# Altium footprint library ICs And Semiconductors SMD.PcbLib: 943 footprints (part 23 of 60)
Each footprint in its own frame and in the unit in brackets; x right, y up, seen from the top. Pads: shape width x height; smd on the part's side, far side on the other; paste and mask are expansions set on the pad; w line width, h text height; cw(c..) or ccw(c..) is an arc to the next point about the centre after c.
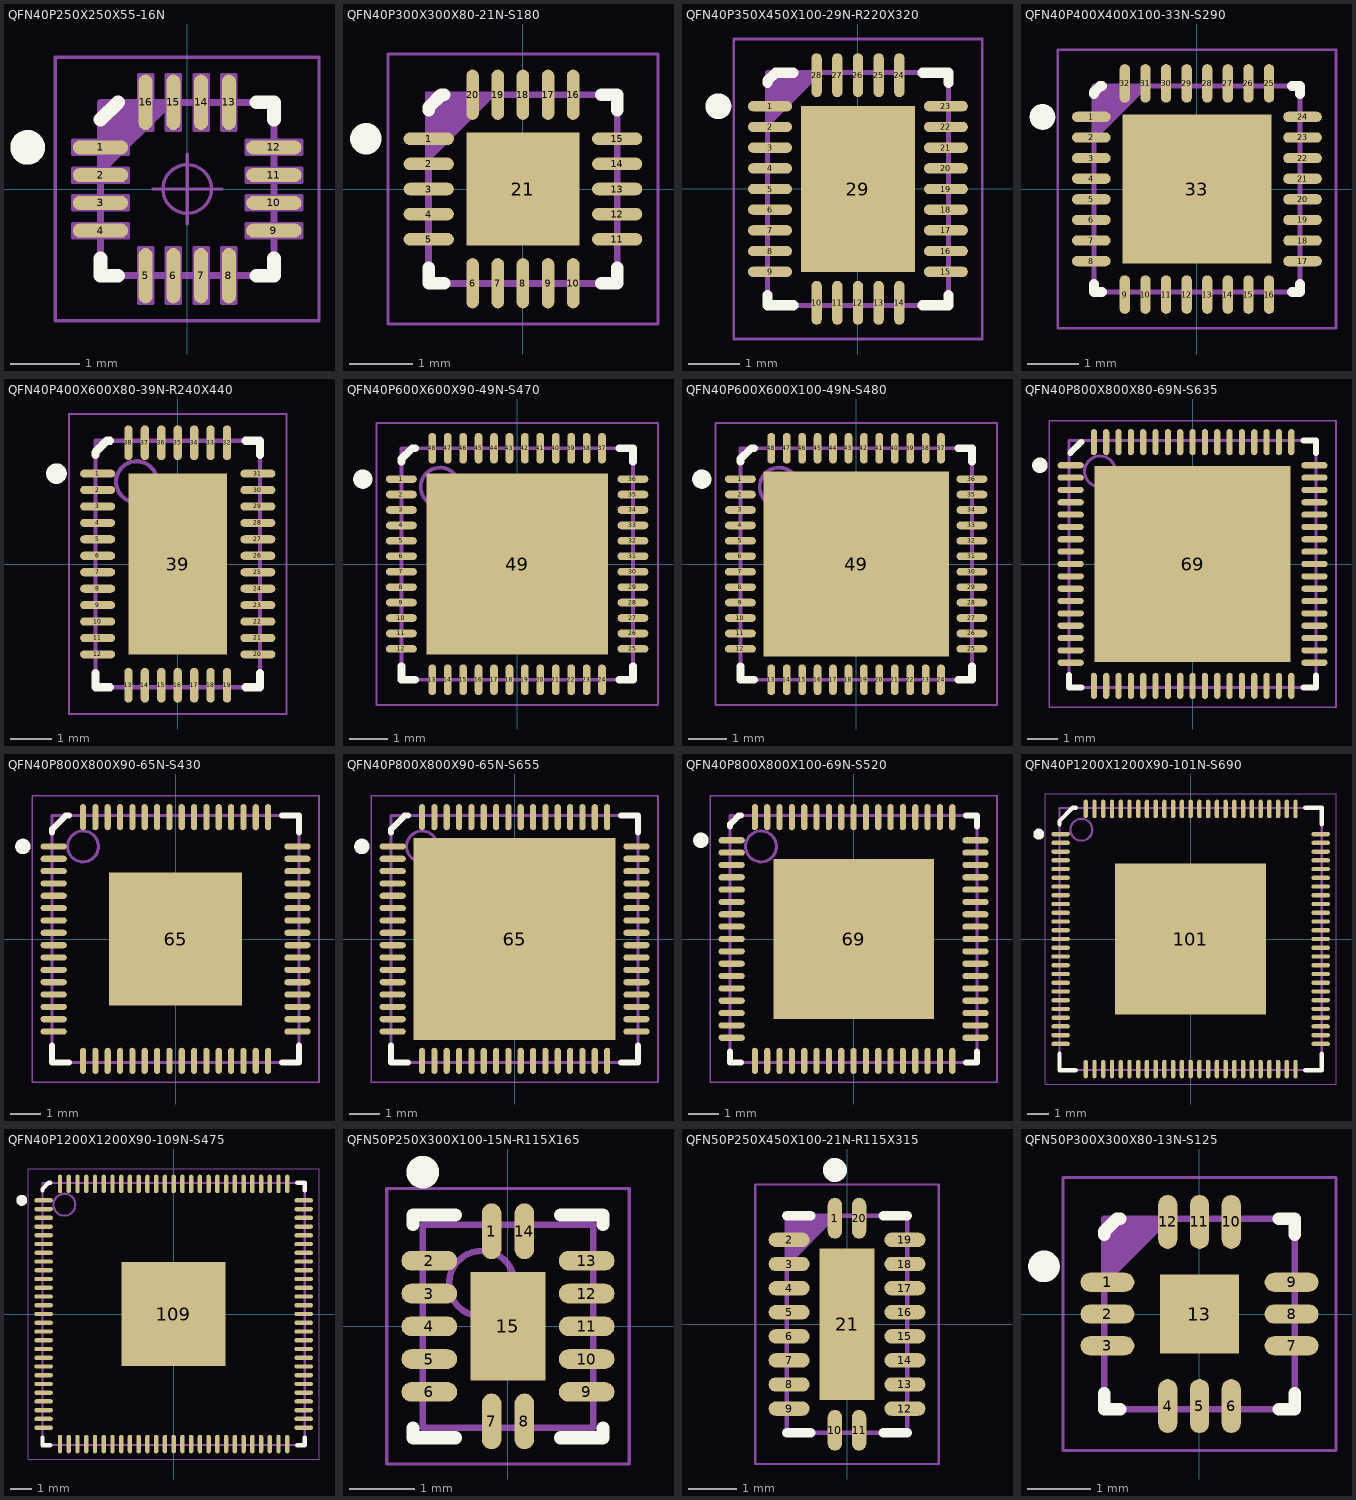
[diagram p22: the footprints below, top view; thin cyan lines are the x and y axes]

## QFN40P250X250X55-16N [mm] "QFN, 0.40mm Pitch, Square; 16 Pin, 2.50mm L X 2.50mm W X 0.55mm H Body, IPC Medium Density"
height 0.55
pads (16):
  oval 0.8x0.2 smd: 1(-1.25,0.6) 2(-1.25,0.2) 3(-1.25,-0.2) 4(-1.25,-0.6) 9(1.25,-0.6) 10(1.25,-0.2) 11(1.25,0.2) 12(1.25,0.6)
  oval 0.2x0.8 smd: 5(-0.6,-1.25) 6(-0.2,-1.25) 7(0.2,-1.25) 8(0.6,-1.25) 13(0.6,1.25) 14(0.2,1.25) 15(-0.2,1.25) 16(-0.6,1.25)
Top Overlay:
  circle w0.25: c-2.3,0.6 r0.125
  lines w0.2: -1.25,-1 -1.25,-1.25 -1,-1.25 ; -1.25,1 -1,1.25 ; 1,-1.25 1.25,-1.25 1.25,-1 ; 1,1.25 1.25,1.25 1.25,1
Mechanical 8:
  lines w0.05: -0.5,0 0,0 ; 0,-0.5 0,0 ; 0,0.5 0,0 ; 0.5,0 0,0 ; -1.65,-0.7 -0.85,-0.7 -0.85,-0.5 -1.65,-0.5 ; -1.65,-0.7 -1.65,-0.5 ; -1.65,-0.7 -1.25,-0.6 -1.65,-0.5 ; -1.65,-0.3 -0.85,-0.3 -0.85,-0.1 -1.65,-0.1 ; -1.65,-0.3 -1.65,-0.1 ; -1.65,-0.3 -1.25,-0.2 -1.65,-0.1 ; -1.65,0.1 -0.85,0.1 -0.85,0.3 -1.65,0.3 ; -1.65,0.1 -1.65,0.3 ; -1.65,0.1 -1.25,0.2 -1.65,0.3 ; -1.65,0.5 -0.85,0.5 -0.85,0.7 -1.65,0.7 ; -1.65,0.5 -1.65,0.7 ; -1.65,0.5 -1.25,0.6 -1.65,0.7 ; -0.7,-1.65 -0.7,-0.85 -0.5,-0.85 -0.5,-1.65 ; -0.7,-1.65 -0.5,-1.65 ; -0.7,-1.65 -0.6,-1.25 -0.5,-1.65 ; -0.7,1.65 -0.7,0.85 -0.5,0.85 -0.5,1.65 ; -0.7,1.65 -0.5,1.65 ; -0.7,1.65 -0.6,1.25 -0.5,1.65 ; -0.3,-1.65 -0.3,-0.85 -0.1,-0.85 -0.1,-1.65 ; -0.3,-1.65 -0.1,-1.65 ; -0.3,-1.65 -0.2,-1.25 -0.1,-1.65 ; -0.3,1.65 -0.3,0.85 -0.1,0.85 -0.1,1.65 ; -0.3,1.65 -0.1,1.65 ; -0.3,1.65 -0.2,1.25 -0.1,1.65 ; 0.1,-1.65 0.1,-0.85 0.3,-0.85 0.3,-1.65 ; 0.1,-1.65 0.3,-1.65 ; 0.1,-1.65 0.2,-1.25 0.3,-1.65 ; 0.1,1.65 0.1,0.85 0.3,0.85 0.3,1.65 ; 0.1,1.65 0.3,1.65 ; 0.1,1.65 0.2,1.25 0.3,1.65 ; 0.5,-1.65 0.5,-0.85 0.7,-0.85 0.7,-1.65 ; 0.5,-1.65 0.7,-1.65 ; 0.5,-1.65 0.6,-1.25 0.7,-1.65 ; 0.5,1.65 0.5,0.85 0.7,0.85 0.7,1.65 ; 0.5,1.65 0.7,1.65 ; 0.5,1.65 0.6,1.25 0.7,1.65 ; 1.65,-0.7 0.85,-0.7 0.85,-0.5 1.65,-0.5 ; 1.65,-0.7 1.65,-0.5 ; 1.65,-0.7 1.25,-0.6 1.65,-0.5 ; 1.65,-0.3 0.85,-0.3 0.85,-0.1 1.65,-0.1 ; 1.65,-0.3 1.65,-0.1 ; 1.65,-0.3 1.25,-0.2 1.65,-0.1 ; 1.65,0.1 0.85,0.1 0.85,0.3 1.65,0.3 ; 1.65,0.1 1.65,0.3 ; 1.65,0.1 1.25,0.2 1.65,0.3 ; 1.65,0.5 0.85,0.5 0.85,0.7 1.65,0.7 ; 1.65,0.5 1.65,0.7 ; 1.65,0.5 1.25,0.6 1.65,0.7
Mechanical 14:
  lines w0.1: -1.25,0.25 -0.25,1.25 ; -1.25,0.35 -0.35,1.25 ; -1.25,0.45 -0.45,1.25 ; -1.25,0.55 -0.55,1.25 ; -1.25,0.65 -0.65,1.25 ; -1.25,0.75 -0.75,1.25 ; -1.25,0.85 -0.85,1.25 ; -1.25,0.95 -0.95,1.25 ; -1.25,1.05 -1.05,1.25 ; -1.25,1.15 -1.15,1.25 ; -1.25,-1.25 1.25,-1.25 1.25,1.25 -1.25,1.25 -1.25,-1.25
Mechanical 15:
  circle w0.05: c0,0 r0.35
  lines w0.05: -0.5,0 0.5,0 ; 0,-0.5 0,0.5 ; -1.9,-1.9 1.9,-1.9 1.9,1.9 -1.9,1.9 -1.9,-1.9
3D body "QFN40P250X250X55-16N.stp": height 0.55, standoff 0, extent -1.25,-1.25 1.25,1.25

## QFN40P300X300X80-21N-S180 [mm] "QFN, 0.40mm Pitch, Square, 20 Pin, 3.00mm L X 3.00mm W X 0.80mm H body (w/thermal tab)"
height 0.8
pads (21):
  oval 0.8x0.2 smd: 1(-1.5,0.8) 2(-1.5,0.4) 3(-1.5,0) 4(-1.5,-0.4) 5(-1.5,-0.8) 11(1.5,-0.8) 12(1.5,-0.4) 13(1.5,0) 14(1.5,0.4) 15(1.5,0.8)
  oval 0.2x0.8 smd: 6(-0.8,-1.5) 7(-0.4,-1.5) 8(0,-1.5) 9(0.4,-1.5) 10(0.8,-1.5) 16(0.8,1.5) 17(0.4,1.5) 18(0,1.5) 19(-0.4,1.5) 20(-0.8,1.5)
  rect 1.8x1.8 smd: 21(0,0)
Top Overlay:
  circle w0.25: c-2.5,0.8 r0.125
  lines w0.2: -1.5,-1.25 -1.5,-1.5 -1.25,-1.5 ; -1.5,1.25 -1.5,1.3 -1.3,1.5 -1.25,1.5 ; 1.25,-1.5 1.5,-1.5 1.5,-1.25 ; 1.25,1.5 1.5,1.5 1.5,1.25
Mechanical 8:
  lines w0.001: -1.55,-1.55 -1.55,1.55 1.55,1.55 1.55,-1.55 -1.55,-1.55
Mechanical 14:
  lines w0.1: -1.5,0.5 -0.5,1.5 ; -1.5,0.6 -0.6,1.5 ; -1.5,0.7 -0.7,1.5 ; -1.5,0.8 -0.8,1.5 ; -1.5,0.9 -0.9,1.5 ; -1.5,1 -1,1.5 ; -1.5,1.1 -1.1,1.5 ; -1.5,1.2 -1.2,1.5 ; -1.5,1.3 -1.3,1.5 ; -1.5,1.4 -1.4,1.5 ; -1.5,-1.5 -1.5,1.5 1.5,1.5 1.5,-1.5 -1.5,-1.5
Mechanical 15:
  circle w0.05: c0,0 r0.35
  lines w0.05: -0.5,0 0.5,0 ; 0,-0.5 0,0.5 ; -2.15,-2.15 -2.15,2.15 2.15,2.15 2.15,-2.15 -2.15,-2.15
3D body "QFN40P300X300X80-21N-S180.stp": height 0.8, standoff 0, extent -1.5,-1.5 1.5,1.5

## QFN40P350X450X100-29N-R220X320 [mm] "QFN, 0.40mm Pitch, Rect.; 28 Pin, 4.50mm L X 3.50mm W X 1.00mm H Body (W/Thermal Tab 2.2mm X 3.2mm), IPC Medium Density"
height 1
pads (29):
  oval 0.85x0.2 smd: 1(-1.7,1.6) 2(-1.7,1.2) 3(-1.7,0.8) 4(-1.7,0.4) 5(-1.7,0) 6(-1.7,-0.4) 7(-1.7,-0.8) 8(-1.7,-1.2) 9(-1.7,-1.6) 15(1.7,-1.6) 16(1.7,-1.2) 17(1.7,-0.8) 18(1.7,-0.4) 19(1.7,0) 20(1.7,0.4) 21(1.7,0.8) 22(1.7,1.2) 23(1.7,1.6)
  oval 0.2x0.85 smd: 10(-0.8,-2.2) 11(-0.4,-2.2) 12(0,-2.2) 13(0.4,-2.2) 14(0.8,-2.2) 24(0.8,2.2) 25(0.4,2.2) 26(0,2.2) 27(-0.4,2.2) 28(-0.8,2.2)
  rect 2.2x3.2 smd: 29(0,0)
Top Overlay:
  circle w0.25: c-2.7,1.6 r0.125
  lines w0.2: -1.75,-2.05 -1.75,-2.25 -1.25,-2.25 ; -1.75,2.05 -1.75,2.09 -1.59,2.25 -1.25,2.25 ; 1.25,-2.25 1.75,-2.25 1.75,-2.05 ; 1.25,2.25 1.75,2.25 1.75,2.05
Mechanical 14:
  lines w0.1: -1.75,1.25 -0.75,2.25 ; -1.75,1.35 -0.85,2.25 ; -1.75,1.45 -0.95,2.25 ; -1.75,1.55 -1.05,2.25 ; -1.75,1.65 -1.15,2.25 ; -1.75,1.75 -1.25,2.25 ; -1.75,1.85 -1.35,2.25 ; -1.75,1.95 -1.45,2.25 ; -1.75,2.05 -1.55,2.25 ; -1.75,2.15 -1.65,2.25 ; -1.75,-2.25 1.75,-2.25 1.75,2.25 -1.75,2.25 -1.75,-2.25
Mechanical 15:
  circle w0.05: c0,0 r0.35
  lines w0.05: -0.5,0 0.5,0 ; 0,-0.5 0,0.5 ; -2.4,-2.9 2.4,-2.9 2.4,2.9 -2.4,2.9 -2.4,-2.9
3D body "QFN40P350X450X100-29N-R220X320.stp": height 1, standoff 0, extent -1.8,-2.3 1.8,2.3

## QFN40P400X400X100-33N-S290 [mm] "QFN, 0.40mm Pitch, Square; 32 Pin, 4.00mm L X 4.00mm W X 1.00mm H body (W/Thermal Tab 2.9mm X 2.9mm), IPC Medium Density"
height 1
pads (33):
  oval 0.75x0.2 smd: 1(-2.05,1.4) 2(-2.05,1) 3(-2.05,0.6) 4(-2.05,0.2) 5(-2.05,-0.2) 6(-2.05,-0.6) 7(-2.05,-1) 8(-2.05,-1.4) 17(2.05,-1.4) 18(2.05,-1) 19(2.05,-0.6) 20(2.05,-0.2) 21(2.05,0.2) 22(2.05,0.6) 23(2.05,1) 24(2.05,1.4)
  oval 0.2x0.75 smd: 9(-1.4,-2.05) 10(-1,-2.05) 11(-0.6,-2.05) 12(-0.2,-2.05) 13(0.2,-2.05) 14(0.6,-2.05) 15(1,-2.05) 16(1.4,-2.05) 25(1.4,2.05) 26(1,2.05) 27(0.6,2.05) 28(0.2,2.05) 29(-0.2,2.05) 30(-0.6,2.05) 31(-1,2.05) 32(-1.4,2.05)
  rect 2.9x2.9 smd: 33(0,0)
Top Overlay:
  circle w0.25: c-3,1.4 r0.125
  lines w0.2: -2,-1.85 -2,-2 -1.85,-2 ; -2,1.85 -2,1.88 -1.88,2 -1.85,2 ; 1.85,-2 2,-2 2,-1.85 ; 1.85,2 2,2 2,1.85
Mechanical 14:
  lines w0.1: -2,1 -1,2 ; -2,1.1 -1.1,2 ; -2,1.2 -1.2,2 ; -2,1.3 -1.3,2 ; -2,1.4 -1.4,2 ; -2,1.5 -1.5,2 ; -2,1.6 -1.6,2 ; -2,1.7 -1.7,2 ; -2,1.8 -1.8,2 ; -2,1.9 -1.9,2 ; -2,-2 -2,2 2,2 2,-2 -2,-2
Mechanical 15:
  circle w0.05: c0,0 r0.35
  lines w0.05: -0.5,0 0.5,0 ; 0,-0.5 0,0.5 ; -2.7,-2.7 -2.7,2.7 2.7,2.7 2.7,-2.7 -2.7,-2.7
3D body "QFN40P400X400X100-33N-S290.stp": height 1, standoff 0, extent -2,-2 2,2

## QFN40P400X600X80-39N-R240X440 [mm] "QFN, 0.40mm Pitch, Rect.; 38 Pin, 6.00mm L X 4.00mm W X 0.80mm H Body (W/Thermal Tab 2.4mm X 4.4mm), IPC Medium Density"
height 0.8
pads (39):
  oval 0.85x0.2 smd: 1(-1.95,2.2) 2(-1.95,1.8) 3(-1.95,1.4) 4(-1.95,1) 5(-1.95,0.6) 6(-1.95,0.2) 7(-1.95,-0.2) 8(-1.95,-0.6) 9(-1.95,-1) 10(-1.95,-1.4) 11(-1.95,-1.8) 12(-1.95,-2.2) 20(1.95,-2.2) 21(1.95,-1.8) 22(1.95,-1.4) 23(1.95,-1) 24(1.95,-0.6) 25(1.95,-0.2) 26(1.95,0.2) 27(1.95,0.6) 28(1.95,1) 29(1.95,1.4) 30(1.95,1.8) 31(1.95,2.2)
  oval 0.2x0.85 smd: 13(-1.2,-2.95) 14(-0.8,-2.95) 15(-0.4,-2.95) 16(0,-2.95) 17(0.4,-2.95) 18(0.8,-2.95) 19(1.2,-2.95) 32(1.2,2.95) 33(0.8,2.95) 34(0.4,2.95) 35(0,2.95) 36(-0.4,2.95) 37(-0.8,2.95) 38(-1.2,2.95)
  rect 2.4x4.4 smd: 39(0,0)
Top Overlay:
  circle w0.25: c-2.95,2.2 r0.125
  lines w0.2: -2,-2.65 -2,-3 -1.65,-3 ; -2,2.65 -2,2.72 -1.72,3 -1.65,3 ; 1.65,-3 2,-3 2,-2.65 ; 1.65,3 2,3 2,2.65
Mechanical 14:
  circle w0.1: c-1,2 r0.5
  lines w0.1: -2,-3 -2,3 2,3 2,-3 -2,-3
Mechanical 15:
  circle w0.05: c0,0 r0.35
  lines w0.05: -0.5,0 0.5,0 ; 0,-0.5 0,0.5 ; -2.65,-3.65 -2.65,3.65 2.65,3.65 2.65,-3.65 -2.65,-3.65
3D body "QFN40P400X600X80-39N-R240X440.stp": height 0.8, standoff 0, extent -2,-3 2,3

## QFN40P600X600X90-49N-S470 [mm] "QFN, 0.40mm Pitch, Square; 48 Pin, 6.00mm L X 6.00mm W X 0.90mm H body (w/thermal tab 4.7 X 4.7mm), IPC Medium Density"
height 0.9
pads (49):
  oval 0.8x0.2 smd: 1(-3,2.2) 2(-3,1.8) 3(-3,1.4) 4(-3,1) 5(-3,0.6) 6(-3,0.2) 7(-3,-0.2) 8(-3,-0.6) 9(-3,-1) 10(-3,-1.4) 11(-3,-1.8) 12(-3,-2.2) 25(3,-2.2) 26(3,-1.8) 27(3,-1.4) 28(3,-1) 29(3,-0.6) 30(3,-0.2) 31(3,0.2) 32(3,0.6) 33(3,1) 34(3,1.4) 35(3,1.8) 36(3,2.2)
  oval 0.2x0.8 smd: 13(-2.2,-3) 14(-1.8,-3) 15(-1.4,-3) 16(-1,-3) 17(-0.6,-3) 18(-0.2,-3) 19(0.2,-3) 20(0.6,-3) 21(1,-3) 22(1.4,-3) 23(1.8,-3) 24(2.2,-3) 37(2.2,3) 38(1.8,3) 39(1.4,3) 40(1,3) 41(0.6,3) 42(0.2,3) 43(-0.2,3) 44(-0.6,3) 45(-1,3) 46(-1.4,3) 47(-1.8,3) 48(-2.2,3)
  rect 4.7x4.7 smd: 49(0,0)
Top Overlay:
  circle w0.25: c-4,2.2 r0.125
  lines w0.2: -3,-2.65 -3,-3 -2.65,-3 ; -3,2.65 -3,2.72 -2.72,3 -2.65,3 ; 2.65,-3 3,-3 3,-2.65 ; 2.65,3 3,3 3,2.65
Top Paste:
  region: -1.77,-1.77 -1.77,-0.29 -0.29,-0.29 -0.29,-1.77
  region: 0.29,-1.77 0.29,-0.29 1.77,-0.29 1.77,-1.77
  region: -1.77,0.29 -1.77,1.77 -0.29,1.77 -0.29,0.29
  region: 0.29,0.29 0.29,1.77 1.77,1.77 1.77,0.29
Mechanical 14:
  circle w0.1: c-2,2 r0.5
  lines w0.1: -3,-3 -3,3 3,3 3,-3 -3,-3
Mechanical 15:
  circle w0.05: c0,0 r0.35
  lines w0.05: -0.5,0 0.5,0 ; 0,-0.5 0,0.5 ; -3.65,-3.65 -3.65,3.65 3.65,3.65 3.65,-3.65 -3.65,-3.65
3D body "QFN40P600X600X90-49N-S470.stp": height 0.9, standoff 0, extent -3,-3 3,3

## QFN40P600X600X100-49N-S480 [mm] "QFN, 0.40mm Pitch, Square; 48 Pin, 6.00mm L X 6.00mm W X 1.00mm H body (w/thermal tab 4.8 X 4.8mm), IPC Medium Density"
height 1
pads (49):
  oval 0.8x0.2 smd: 1(-3,2.2) 2(-3,1.8) 3(-3,1.4) 4(-3,1) 5(-3,0.6) 6(-3,0.2) 7(-3,-0.2) 8(-3,-0.6) 9(-3,-1) 10(-3,-1.4) 11(-3,-1.8) 12(-3,-2.2) 25(3,-2.2) 26(3,-1.8) 27(3,-1.4) 28(3,-1) 29(3,-0.6) 30(3,-0.2) 31(3,0.2) 32(3,0.6) 33(3,1) 34(3,1.4) 35(3,1.8) 36(3,2.2)
  oval 0.2x0.8 smd: 13(-2.2,-3) 14(-1.8,-3) 15(-1.4,-3) 16(-1,-3) 17(-0.6,-3) 18(-0.2,-3) 19(0.2,-3) 20(0.6,-3) 21(1,-3) 22(1.4,-3) 23(1.8,-3) 24(2.2,-3) 37(2.2,3) 38(1.8,3) 39(1.4,3) 40(1,3) 41(0.6,3) 42(0.2,3) 43(-0.2,3) 44(-0.6,3) 45(-1,3) 46(-1.4,3) 47(-1.8,3) 48(-2.2,3)
  rect 4.8x4.8 smd: 49(0,0)
Top Overlay:
  circle w0.25: c-4,2.2 r0.125
  lines w0.2: -3,-2.65 -3,-3 -2.65,-3 ; -3,2.65 -3,2.72 -2.72,3 -2.65,3 ; 2.65,-3 3,-3 3,-2.65 ; 2.65,3 3,3 3,2.65
Top Paste:
  region: -1.81,-1.81 -1.81,-0.29 -0.29,-0.29 -0.29,-1.81
  region: 0.29,-1.81 0.29,-0.29 1.81,-0.29 1.81,-1.81
  region: -1.81,0.29 -1.81,1.81 -0.29,1.81 -0.29,0.29
  region: 0.29,0.29 0.29,1.81 1.81,1.81 1.81,0.29
Mechanical 14:
  circle w0.1: c-2,2 r0.5
  lines w0.1: -3,-3 -3,3 3,3 3,-3 -3,-3
Mechanical 15:
  circle w0.05: c0,0 r0.35
  lines w0.05: -0.5,0 0.5,0 ; 0,-0.5 0,0.5 ; -3.65,-3.65 -3.65,3.65 3.65,3.65 3.65,-3.65 -3.65,-3.65
3D body "QFN40P600X600X100-49N-S480.stp": height 1, standoff 0, extent -3,-3 3,3

## QFN40P800X800X80-69N-S635 [mm] "QFN, 0.40mm Pitch, Square; 68 Pin, 8.00mm L X 8.00mm W X 0.80mm H Body (W/Thermal Tab 6.35mm X 6.35mm), IPC Medium Density"
height 0.8
pads (69):
  oval 0.85x0.2 smd: 1(-3.95,3.2) 2(-3.95,2.8) 3(-3.95,2.4) 4(-3.95,2) 5(-3.95,1.6) 6(-3.95,1.2) 7(-3.95,0.8) 8(-3.95,0.4) 9(-3.95,0) 10(-3.95,-0.4) 11(-3.95,-0.8) 12(-3.95,-1.2) 13(-3.95,-1.6) 14(-3.95,-2) 15(-3.95,-2.4) 16(-3.95,-2.8) 17(-3.95,-3.2) 35(3.95,-3.2) 36(3.95,-2.8) 37(3.95,-2.4) 38(3.95,-2) 39(3.95,-1.6) 40(3.95,-1.2) 41(3.95,-0.8) 42(3.95,-0.4) 43(3.95,0) 44(3.95,0.4) 45(3.95,0.8) 46(3.95,1.2) 47(3.95,1.6) 48(3.95,2) 49(3.95,2.4) 50(3.95,2.8) 51(3.95,3.2)
  oval 0.2x0.85 smd: 18(-3.2,-3.95) 19(-2.8,-3.95) 20(-2.4,-3.95) 21(-2,-3.95) 22(-1.6,-3.95) 23(-1.2,-3.95) 24(-0.8,-3.95) 25(-0.4,-3.95) 26(0,-3.95) 27(0.4,-3.95) 28(0.8,-3.95) 29(1.2,-3.95) 30(1.6,-3.95) 31(2,-3.95) 32(2.4,-3.95) 33(2.8,-3.95) 34(3.2,-3.95) 52(3.2,3.95) 53(2.8,3.95) 54(2.4,3.95) 55(2,3.95) 56(1.6,3.95) 57(1.2,3.95) 58(0.8,3.95) 59(0.4,3.95) 60(0,3.95) 61(-0.4,3.95) 62(-0.8,3.95) 63(-1.2,3.95) 64(-1.6,3.95) 65(-2,3.95) 66(-2.4,3.95) 67(-2.8,3.95) 68(-3.2,3.95)
  rect 6.35x6.35 smd: 69(0,0)
Top Overlay:
  circle w0.25: c-4.95,3.2 r0.125
  lines w0.2: -4,-3.6 -4,-4 -3.6,-4 ; -3.96,3.6 -3.6,3.96 ; 3.6,-4 4,-4 4,-3.61 ; 3.6,4 4,4 4,3.6
Top Paste:
  region: 1.29,1.29 1.29,2.67 2.67,2.67 2.67,1.29
  region: -0.69,1.29 -0.69,2.67 0.69,2.67 0.69,1.29
  region: -2.67,1.29 -2.67,2.67 -1.29,2.67 -1.29,1.29
  region: 1.29,-0.69 1.29,0.69 2.67,0.69 2.67,-0.69
  region: -0.69,-0.69 -0.69,0.69 0.69,0.69 0.69,-0.69
  region: -2.67,-0.69 -2.67,0.69 -1.29,0.69 -1.29,-0.69
  region: 1.29,-2.67 1.29,-1.29 2.67,-1.29 2.67,-2.67
  region: -0.69,-2.67 -0.69,-1.29 0.69,-1.29 0.69,-2.67
  region: -2.67,-2.67 -2.67,-1.29 -1.29,-1.29 -1.29,-2.67
Mechanical 14:
  circle w0.1: c-3,3 r0.5
  lines w0.1: -4,-4 4,-4 4,4 -4,4 -4,-4
Mechanical 15:
  circle w0.05: c0,0 r0.35
  lines w0.05: -0.5,0 0.5,0 ; 0,-0.5 0,0.5 ; -4.65,-4.65 4.65,-4.65 4.65,4.65 -4.65,4.65 -4.65,-4.65
3D body "QFN40P800X800X80-69N-S635.stp": height 0.8, standoff 0, extent -4,-4 4,4

## QFN40P800X800X90-65N-S430 [mm] "QFN, 0.40mm Pitch, Square; 64 Pin, 8.00mm L X 8.00mm W X 0.90mm H body (W/Thermal Tab 4.30mm X 4.30mm), IPC Medium Density"
height 0.9
pads (65):
  oval 0.85x0.2 smd: 1(-3.95,3) 2(-3.95,2.6) 3(-3.95,2.2) 4(-3.95,1.8) 5(-3.95,1.4) 6(-3.95,1) 7(-3.95,0.6) 8(-3.95,0.2) 9(-3.95,-0.2) 10(-3.95,-0.6) 11(-3.95,-1) 12(-3.95,-1.4) 13(-3.95,-1.8) 14(-3.95,-2.2) 15(-3.95,-2.6) 16(-3.95,-3) 33(3.95,-3) 34(3.95,-2.6) 35(3.95,-2.2) 36(3.95,-1.8) 37(3.95,-1.4) 38(3.95,-1) 39(3.95,-0.6) 40(3.95,-0.2) 41(3.95,0.2) 42(3.95,0.6) 43(3.95,1) 44(3.95,1.4) 45(3.95,1.8) 46(3.95,2.2) 47(3.95,2.6) 48(3.95,3)
  oval 0.2x0.85 smd: 17(-3,-3.95) 18(-2.6,-3.95) 19(-2.2,-3.95) 20(-1.8,-3.95) 21(-1.4,-3.95) 22(-1,-3.95) 23(-0.6,-3.95) 24(-0.2,-3.95) 25(0.2,-3.95) 26(0.6,-3.95) 27(1,-3.95) 28(1.4,-3.95) 29(1.8,-3.95) 30(2.2,-3.95) 31(2.6,-3.95) 32(3,-3.95) 49(3,3.95) 50(2.6,3.95) 51(2.2,3.95) 52(1.8,3.95) 53(1.4,3.95) 54(1,3.95) 55(0.6,3.95) 56(0.2,3.95) 57(-0.2,3.95) 58(-0.6,3.95) 59(-1,3.95) 60(-1.4,3.95) 61(-1.8,3.95) 62(-2.2,3.95) 63(-2.6,3.95) 64(-3,3.95)
  rect 4.3x4.3 smd paste+0: 65(0,0)
Top Overlay:
  circle w0.25: c-4.95,3 r0.125
  lines w0.2: -4,-3.45 -4,-4 -3.45,-4 ; -4,3.45 -4,3.56 -3.56,4 -3.45,4 ; 3.45,-4 4,-4 4,-3.45 ; 3.45,4 4,4 4,3.45
Top Paste:
  region: -1.77,-1.77 -1.77,-0.29 -0.29,-0.29 -0.29,-1.77
  region: 0.29,-1.77 0.29,-0.29 1.77,-0.29 1.77,-1.77
  region: -1.77,0.29 -1.77,1.77 -0.29,1.77 -0.29,0.29
  region: 0.29,0.29 0.29,1.77 1.77,1.77 1.77,0.29
Mechanical 14:
  circle w0.1: c-3,3 r0.5
  lines w0.1: -4,-4 4,-4 4,4 -4,4 -4,-4
Mechanical 15:
  circle w0.05: c0,0 r0.35
  lines w0.05: -0.5,0 0.5,0 ; 0,-0.5 0,0.5 ; -4.65,-4.65 4.65,-4.65 4.65,4.65 -4.65,4.65 -4.65,-4.65
3D body "QFN40P800X800X90-65N-S430.stp": height 0.9, standoff 0, extent -4,-4 4,4

## QFN40P800X800X90-65N-S655 [mm] "QFN, 0.40mm Pitch, Square; 64 Pin, 8.00mm L X 8.00mm W X 0.90mm H body (W/Thermal Tab 6.55mm X 6.55mm), IPC Medium Density"
height 0.9
pads (65):
  oval 0.85x0.2 smd: 1(-3.95,3) 2(-3.95,2.6) 3(-3.95,2.2) 4(-3.95,1.8) 5(-3.95,1.4) 6(-3.95,1) 7(-3.95,0.6) 8(-3.95,0.2) 9(-3.95,-0.2) 10(-3.95,-0.6) 11(-3.95,-1) 12(-3.95,-1.4) 13(-3.95,-1.8) 14(-3.95,-2.2) 15(-3.95,-2.6) 16(-3.95,-3) 33(3.95,-3) 34(3.95,-2.6) 35(3.95,-2.2) 36(3.95,-1.8) 37(3.95,-1.4) 38(3.95,-1) 39(3.95,-0.6) 40(3.95,-0.2) 41(3.95,0.2) 42(3.95,0.6) 43(3.95,1) 44(3.95,1.4) 45(3.95,1.8) 46(3.95,2.2) 47(3.95,2.6) 48(3.95,3)
  oval 0.2x0.85 smd: 17(-3,-3.95) 18(-2.6,-3.95) 19(-2.2,-3.95) 20(-1.8,-3.95) 21(-1.4,-3.95) 22(-1,-3.95) 23(-0.6,-3.95) 24(-0.2,-3.95) 25(0.2,-3.95) 26(0.6,-3.95) 27(1,-3.95) 28(1.4,-3.95) 29(1.8,-3.95) 30(2.2,-3.95) 31(2.6,-3.95) 32(3,-3.95) 49(3,3.95) 50(2.6,3.95) 51(2.2,3.95) 52(1.8,3.95) 53(1.4,3.95) 54(1,3.95) 55(0.6,3.95) 56(0.2,3.95) 57(-0.2,3.95) 58(-0.6,3.95) 59(-1,3.95) 60(-1.4,3.95) 61(-1.8,3.95) 62(-2.2,3.95) 63(-2.6,3.95) 64(-3,3.95)
  rect 6.55x6.55 smd: 65(0,0)
Top Overlay:
  circle w0.25: c-4.95,3 r0.125
  lines w0.2: -4,-3.45 -4,-4 -3.45,-4 ; -4,3.45 -4,3.56 -3.56,4 -3.45,4 ; 3.45,-4 4,-4 4,-3.45 ; 3.45,4 4,4 4,3.45
Top Paste:
  region: 1.29,1.29 1.29,2.67 2.67,2.67 2.67,1.29
  region: -0.69,1.29 -0.69,2.67 0.69,2.67 0.69,1.29
  region: -2.67,1.29 -2.67,2.67 -1.29,2.67 -1.29,1.29
  region: 1.29,-0.69 1.29,0.69 2.67,0.69 2.67,-0.69
  region: -0.69,-0.69 -0.69,0.69 0.69,0.69 0.69,-0.69
  region: -2.67,-0.69 -2.67,0.69 -1.29,0.69 -1.29,-0.69
  region: 1.29,-2.67 1.29,-1.29 2.67,-1.29 2.67,-2.67
  region: -0.69,-2.67 -0.69,-1.29 0.69,-1.29 0.69,-2.67
  region: -2.67,-2.67 -2.67,-1.29 -1.29,-1.29 -1.29,-2.67
Mechanical 14:
  circle w0.1: c-3,3 r0.5
  lines w0.1: -4,-4 4,-4 4,4 -4,4 -4,-4
Mechanical 15:
  circle w0.05: c0,0 r0.35
  lines w0.05: -0.5,0 0.5,0 ; 0,-0.5 0,0.5 ; -4.65,-4.65 4.65,-4.65 4.65,4.65 -4.65,4.65 -4.65,-4.65
3D body "QFN40P800X800X90-65N-S655.stp": height 0.9, standoff 0, extent -4,-4 4,4

## QFN40P800X800X100-69N-S520 [mm] "QFN, 0.40mm Pitch, Square; 64 Pin, 8.00mm L X 8.00mm W X 1.00mm H body (W/Thermal Tab 5.20mm X 5.20mm), IPC Medium Density"
height 1
pads (69):
  oval 0.85x0.2 smd: 1(-3.95,3.2) 2(-3.95,2.8) 3(-3.95,2.4) 4(-3.95,2) 5(-3.95,1.6) 6(-3.95,1.2) 7(-3.95,0.8) 8(-3.95,0.4) 9(-3.95,0) 10(-3.95,-0.4) 11(-3.95,-0.8) 12(-3.95,-1.2) 13(-3.95,-1.6) 14(-3.95,-2) 15(-3.95,-2.4) 16(-3.95,-2.8) 17(-3.95,-3.2) 35(3.95,-3.2) 36(3.95,-2.8) 37(3.95,-2.4) 38(3.95,-2) 39(3.95,-1.6) 40(3.95,-1.2) 41(3.95,-0.8) 42(3.95,-0.4) 43(3.95,0) 44(3.95,0.4) 45(3.95,0.8) 46(3.95,1.2) 47(3.95,1.6) 48(3.95,2) 49(3.95,2.4) 50(3.95,2.8) 51(3.95,3.2)
  oval 0.2x0.85 smd: 18(-3.2,-3.95) 19(-2.8,-3.95) 20(-2.4,-3.95) 21(-2,-3.95) 22(-1.6,-3.95) 23(-1.2,-3.95) 24(-0.8,-3.95) 25(-0.4,-3.95) 26(0,-3.95) 27(0.4,-3.95) 28(0.8,-3.95) 29(1.2,-3.95) 30(1.6,-3.95) 31(2,-3.95) 32(2.4,-3.95) 33(2.8,-3.95) 34(3.2,-3.95) 52(3.2,3.95) 53(2.8,3.95) 54(2.4,3.95) 55(2,3.95) 56(1.6,3.95) 57(1.2,3.95) 58(0.8,3.95) 59(0.4,3.95) 60(0,3.95) 61(-0.4,3.95) 62(-0.8,3.95) 63(-1.2,3.95) 64(-1.6,3.95) 65(-2,3.95) 66(-2.4,3.95) 67(-2.8,3.95) 68(-3.2,3.95)
  rect 5.2x5.2 smd: 69(0,0)
Top Overlay:
  circle w0.25: c-4.95,3.2 r0.125
  lines w0.2: -4,-3.65 -4,-4 -3.65,-4 ; -4,3.65 -4,3.72 -3.72,4 -3.65,4 ; 3.65,-4 4,-4 4,-3.65 ; 3.65,4 4,4 4,3.65
Mechanical 14:
  circle w0.1: c-3,3 r0.5
  lines w0.1: -4,-4 -4,4 4,4 4,-4 -4,-4
Mechanical 15:
  circle w0.05: c0,0 r0.35
  lines w0.05: -0.5,0 0.5,0 ; 0,-0.5 0,0.5 ; -4.65,-4.65 -4.65,4.65 4.65,4.65 4.65,-4.65 -4.65,-4.65
Drill Drawing:
  region: -1.96,-1.96 -1.96,-0.32 -0.32,-0.32 -0.32,-1.96
  region: 0.32,-1.96 0.32,-0.32 1.96,-0.32 1.96,-1.96
  region: -1.96,0.32 -1.96,1.96 -0.32,1.96 -0.32,0.32
  region: 0.32,0.32 0.32,1.96 1.96,1.96 1.96,0.32
3D body "QFN40P800X800X100-65N-S520.stp": height 1, standoff 0, extent -4,-4 4,4

## QFN40P1200X1200X90-101N-S690 [mm] "QFN, 0.40mm pitch, square; 25 pin X 25 pin, 12.00mm X 12.00mm (w/thermal tab 6.9mm X 6.9mm)"
height 0.9
pads (101):
  oval 0.85x0.2 smd: 1(-5.95,4.8) 2(-5.95,4.4) 3(-5.95,4) 4(-5.95,3.6) 5(-5.95,3.2) 6(-5.95,2.8) 7(-5.95,2.4) 8(-5.95,2) 9(-5.95,1.6) 10(-5.95,1.2) 11(-5.95,0.8) 12(-5.95,0.4) 13(-5.95,0) 14(-5.95,-0.4) 15(-5.95,-0.8) 16(-5.95,-1.2) 17(-5.95,-1.6) 18(-5.95,-2) 19(-5.95,-2.4) 20(-5.95,-2.8) 21(-5.95,-3.2) 22(-5.95,-3.6) 23(-5.95,-4) 24(-5.95,-4.4) 25(-5.95,-4.8) 51(5.95,-4.8) 52(5.95,-4.4) 53(5.95,-4) 54(5.95,-3.6) 55(5.95,-3.2) 56(5.95,-2.8) 57(5.95,-2.4) 58(5.95,-2) 59(5.95,-1.6) 60(5.95,-1.2) 61(5.95,-0.8) 62(5.95,-0.4) 63(5.95,0) 64(5.95,0.4) 65(5.95,0.8) 66(5.95,1.2) 67(5.95,1.6) 68(5.95,2) 69(5.95,2.4) 70(5.95,2.8) 71(5.95,3.2) 72(5.95,3.6) 73(5.95,4) 74(5.95,4.4) 75(5.95,4.8)
  oval 0.2x0.85 smd: 26(-4.8,-5.95) 27(-4.4,-5.95) 28(-4,-5.95) 29(-3.6,-5.95) 30(-3.2,-5.95) 31(-2.8,-5.95) 32(-2.4,-5.95) 33(-2,-5.95) 34(-1.6,-5.95) 35(-1.2,-5.95) 36(-0.8,-5.95) 37(-0.4,-5.95) 38(0,-5.95) 39(0.4,-5.95) 40(0.8,-5.95) 41(1.2,-5.95) 42(1.6,-5.95) 43(2,-5.95) 44(2.4,-5.95) 45(2.8,-5.95) 46(3.2,-5.95) 47(3.6,-5.95) 48(4,-5.95) 49(4.4,-5.95) 50(4.8,-5.95) 76(4.8,5.95) 77(4.4,5.95) 78(4,5.95) 79(3.6,5.95) 80(3.2,5.95) 81(2.8,5.95) 82(2.4,5.95) 83(2,5.95) 84(1.6,5.95) 85(1.2,5.95) 86(0.8,5.95) 87(0.4,5.95) 88(0,5.95) 89(-0.4,5.95) 90(-0.8,5.95) 91(-1.2,5.95) 92(-1.6,5.95) 93(-2,5.95) 94(-2.4,5.95) 95(-2.8,5.95) 96(-3.2,5.95) 97(-3.6,5.95) 98(-4,5.95) 99(-4.4,5.95) 100(-4.8,5.95)
  rect 6.9x6.9 smd: 101(0,0)
Top Overlay:
  circle w0.25: c-6.95,4.8 r0.125
  lines w0.2: -6,-5.25 -6,-6 -5.25,-6 ; -6,5.25 -6,5.4 -5.4,6 -5.25,6 ; 5.25,-6 6,-6 6,-5.25 ; 5.25,6 6,6 6,5.25
Top Paste:
  region: -2.6,-2.6 -2.6,-0.42 -0.42,-0.42 -0.42,-2.6
  region: 0.42,-2.6 0.42,-0.42 2.6,-0.42 2.6,-2.6
  region: -2.6,0.42 -2.6,2.6 -0.42,2.6 -0.42,0.42
  region: 0.42,0.42 0.42,2.6 2.6,2.6 2.6,0.42
Mechanical 14:
  circle w0.1: c-5,5 r0.5
  lines w0.1: -6,-6 -6,6 6,6 6,-6 -6,-6
Mechanical 15:
  circle w0.05: c0,0 r0.35
  lines w0.05: -0.5,0 0.5,0 ; 0,-0.5 0,0.5 ; -6.65,-6.65 -6.65,6.65 6.65,6.65 6.65,-6.65 -6.65,-6.65
3D body "QFN40P1200X1200X90-101N-S690.stp": height 0.9, standoff 0, extent -6.05,-6.05 6.05,6.05

## QFN40P1200X1200X90-109N-S475 [mm] "QFN, 0.40mm pitch, square; 27 pin X 27 pin, 12.00mm X 12.00mm (w/thermal tab 4.75 X 4.75mm)"
height 0.9
pads (109):
  oval 0.85x0.2 smd: 1(-5.95,5.2) 2(-5.95,4.8) 3(-5.95,4.4) 4(-5.95,4) 5(-5.95,3.6) 6(-5.95,3.2) 7(-5.95,2.8) 8(-5.95,2.4) 9(-5.95,2) 10(-5.95,1.6) 11(-5.95,1.2) 12(-5.95,0.8) 13(-5.95,0.4) 14(-5.95,0) 15(-5.95,-0.4) 16(-5.95,-0.8) 17(-5.95,-1.2) 18(-5.95,-1.6) 19(-5.95,-2) 20(-5.95,-2.4) 21(-5.95,-2.8) 22(-5.95,-3.2) 23(-5.95,-3.6) 24(-5.95,-4) 25(-5.95,-4.4) 26(-5.95,-4.8) 27(-5.95,-5.2) 55(5.95,-5.2) 56(5.95,-4.8) 57(5.95,-4.4) 58(5.95,-4) 59(5.95,-3.6) 60(5.95,-3.2) 61(5.95,-2.8) 62(5.95,-2.4) 63(5.95,-2) 64(5.95,-1.6) 65(5.95,-1.2) 66(5.95,-0.8) 67(5.95,-0.4) 68(5.95,0) 69(5.95,0.4) 70(5.95,0.8) 71(5.95,1.2) 72(5.95,1.6) 73(5.95,2) 74(5.95,2.4) 75(5.95,2.8) 76(5.95,3.2) 77(5.95,3.6) 78(5.95,4) 79(5.95,4.4) 80(5.95,4.8) 81(5.95,5.2)
  oval 0.2x0.85 smd: 28(-5.2,-5.95) 29(-4.8,-5.95) 30(-4.4,-5.95) 31(-4,-5.95) 32(-3.6,-5.95) 33(-3.2,-5.95) 34(-2.8,-5.95) 35(-2.4,-5.95) 36(-2,-5.95) 37(-1.6,-5.95) 38(-1.2,-5.95) 39(-0.8,-5.95) 40(-0.4,-5.95) 41(0,-5.95) 42(0.4,-5.95) 43(0.8,-5.95) 44(1.2,-5.95) 45(1.6,-5.95) 46(2,-5.95) 47(2.4,-5.95) 48(2.8,-5.95) 49(3.2,-5.95) 50(3.6,-5.95) 51(4,-5.95) 52(4.4,-5.95) 53(4.8,-5.95) 54(5.2,-5.95) 82(5.2,5.95) 83(4.8,5.95) 84(4.4,5.95) 85(4,5.95) 86(3.6,5.95) 87(3.2,5.95) 88(2.8,5.95) 89(2.4,5.95) 90(2,5.95) 91(1.6,5.95) 92(1.2,5.95) 93(0.8,5.95) 94(0.4,5.95) 95(0,5.95) 96(-0.4,5.95) 97(-0.8,5.95) 98(-1.2,5.95) 99(-1.6,5.95) 100(-2,5.95) 101(-2.4,5.95) 102(-2.8,5.95) 103(-3.2,5.95) 104(-3.6,5.95) 105(-4,5.95) 106(-4.4,5.95) 107(-4.8,5.95) 108(-5.2,5.95)
  rect 4.75x4.75 smd paste-0.875: 109(0,0)
Top Overlay:
  circle w0.25: c-6.95,5.2 r0.125
  lines w0.2: -6,-5.65 -6,-6 -5.65,-6 ; -6,5.65 -6,5.72 -5.72,6 -5.65,6 ; 5.65,-6 6,-6 6,-5.65 ; 5.65,6 6,6 6,5.65
Mechanical 14:
  circle w0.1: c-5,5 r0.5
  lines w0.1: -6,-6 6,-6 6,6 -6,6 -6,-6
Mechanical 15:
  circle w0.05: c0,0 r0.35
  lines w0.05: -0.5,0 0.5,0 ; 0,-0.5 0,0.5 ; -6.65,-6.65 6.65,-6.65 6.65,6.65 -6.65,6.65 -6.65,-6.65
3D body "QFN40P1200X1200X90-109N-S475.stp": height 0.9, standoff 0, extent -6.05,-6.05 6.05,6.05

## QFN50P250X300X100-15N-R115X165 [mm] "QFN, 0.50mm Pitch, Rect.; 14 Pin, 2.50mm L X 3.00mm W X 1.00mm H Body (w/Thermal Tab 1.15 X 1.65mm),  IPC Medium Density"
height 1
pads (15):
  oval 0.3x0.85 smd: 1(-0.25,1.45) 7(-0.25,-1.45) 8(0.25,-1.45) 14(0.25,1.45)
  oval 0.85x0.3 smd: 2(-1.2,1) 3(-1.2,0.5) 4(-1.2,0) 5(-1.2,-0.5) 6(-1.2,-1) 9(1.2,-1) 10(1.2,-0.5) 11(1.2,0) 12(1.2,0.5) 13(1.2,1)
  rect 1.15x1.65 smd: 15(0,0)
Top Overlay:
  circle w0.25: c-1.3,2.35 r0.125
  lines w0.2: -1.45,-1.55 -1.45,-1.7 -0.8,-1.7 ; -1.45,1.55 -1.45,1.7 -0.8,1.7 ; 0.8,-1.7 1.45,-1.7 1.45,-1.55 ; 0.8,1.7 1.45,1.7 1.45,1.55
Mechanical 14:
  circle w0.1: c-0.4,0.65 r0.5
  lines w0.1: -1.3,-1.55 1.3,-1.55 1.3,1.55 -1.3,1.55 -1.3,-1.55
Mechanical 15:
  lines w0.05: -1.85,-2.1 1.85,-2.1 1.85,2.1 -1.85,2.1 -1.85,-2.1
3D body "QFN50P250X300X100-15N-R115X165.stp": height 1, standoff 0, extent -1.3,-1.55 1.3,1.55

## QFN50P250X450X100-21N-R115X315 [mm] "QFN, 0.50mm Pitch, Rect.; 20 Pin, 2.50mm L X 4.50mm W X 1.00mm H Body (w/Thermal Tab 1.15 X 3.15mm),  IPC Medium Density"
height 1
pads (21):
  oval 0.3x0.85 smd: 1(-0.25,2.2) 10(-0.25,-2.2) 11(0.25,-2.2) 20(0.25,2.2)
  oval 0.85x0.3 smd: 2(-1.2,1.75) 3(-1.2,1.25) 4(-1.2,0.75) 5(-1.2,0.25) 6(-1.2,-0.25) 7(-1.2,-0.75) 8(-1.2,-1.25) 9(-1.2,-1.75) 12(1.2,-1.75) 13(1.2,-1.25) 14(1.2,-0.75) 15(1.2,-0.25) 16(1.2,0.25) 17(1.2,0.75) 18(1.2,1.25) 19(1.2,1.75)
  rect 1.15x3.15 smd paste-0.295: 21(0,0)
Top Overlay:
  circle w0.25: c-0.25,3.2 r0.125
  lines w0.2: -1.25,-2.25 -0.75,-2.25 ; -1.25,2.25 -0.75,2.25 ; 0.75,-2.25 1.25,-2.25 ; 0.75,2.25 1.25,2.25
Mechanical 14:
  lines w0.1: -1.25,1.25 -0.25,2.25 ; -1.25,1.35 -0.35,2.25 ; -1.25,1.45 -0.45,2.25 ; -1.25,1.55 -0.55,2.25 ; -1.25,1.65 -0.65,2.25 ; -1.25,1.75 -0.75,2.25 ; -1.25,1.85 -0.85,2.25 ; -1.25,1.95 -0.95,2.25 ; -1.25,2.05 -1.05,2.25 ; -1.25,2.15 -1.15,2.25 ; -1.25,-2.25 -1.25,2.25 1.25,2.25 1.25,-2.25 -1.25,-2.25
Mechanical 15:
  circle w0.05: c0,0 r0.35
  lines w0.05: -0.5,0 0.5,0 ; 0,-0.5 0,0.5 ; -1.9,-2.9 -1.9,2.9 1.9,2.9 1.9,-2.9 -1.9,-2.9
3D body "QFN50P250X450X100-21N-R115X315.stp": height 1, standoff 0, extent -1.3,-2.3 1.3,2.3

## QFN50P300X300X80-13N-S125 [mm] "QFN, 0.50mm pitch, square; 3 pin X 3 pin, 3mm X 3mm X 0.80mm H body (w/thermal tab 1.25 X 1.25mm),  IPC Medium Density"
height 0.8
pads (13):
  oval 0.85x0.3 smd: 1(-1.45,0.5) 2(-1.45,0) 3(-1.45,-0.5) 7(1.45,-0.5) 8(1.45,0) 9(1.45,0.5)
  oval 0.3x0.85 smd: 4(-0.5,-1.45) 5(0,-1.45) 6(0.5,-1.45) 10(0.5,1.45) 11(0,1.45) 12(-0.5,1.45)
  rect 1.25x1.25 smd: 13(0,0)
Top Overlay:
  circle w0.25: c-2.45,0.75 r0.125
  lines w0.2: -1.5,-1.25 -1.5,-1.5 -1.25,-1.5 ; -1.5,1.25 -1.5,1.3 -1.3,1.5 -1.25,1.5 ; 1.25,-1.5 1.5,-1.5 1.5,-1.25 ; 1.25,1.5 1.5,1.5 1.5,1.25
Mechanical 14:
  lines w0.1: -1.5,0.5 -0.5,1.5 ; -1.5,0.6 -0.6,1.5 ; -1.5,0.7 -0.7,1.5 ; -1.5,0.8 -0.8,1.5 ; -1.5,0.9 -0.9,1.5 ; -1.5,1 -1,1.5 ; -1.5,1.1 -1.1,1.5 ; -1.5,1.2 -1.2,1.5 ; -1.5,1.3 -1.3,1.5 ; -1.5,1.4 -1.4,1.5 ; -1.5,-1.5 1.5,-1.5 1.5,1.5 -1.5,1.5 -1.5,-1.5
Mechanical 15:
  lines w0.05: -0.5,0 0.5,0 ; 0,-0.5 0,0.5 ; -2.15,-2.15 2.15,-2.15 2.15,2.15 -2.15,2.15 -2.15,-2.15
3D body "QFN50P300X300X80-13N-S125.stp": height 0.8, standoff 0, extent -1.575,-1.575 1.575,1.575